# Altium integrated library Mylib Rev 4.IntLib: 207 symbols (part 3 of 3) (continued)
## ST802RT1A (continued)

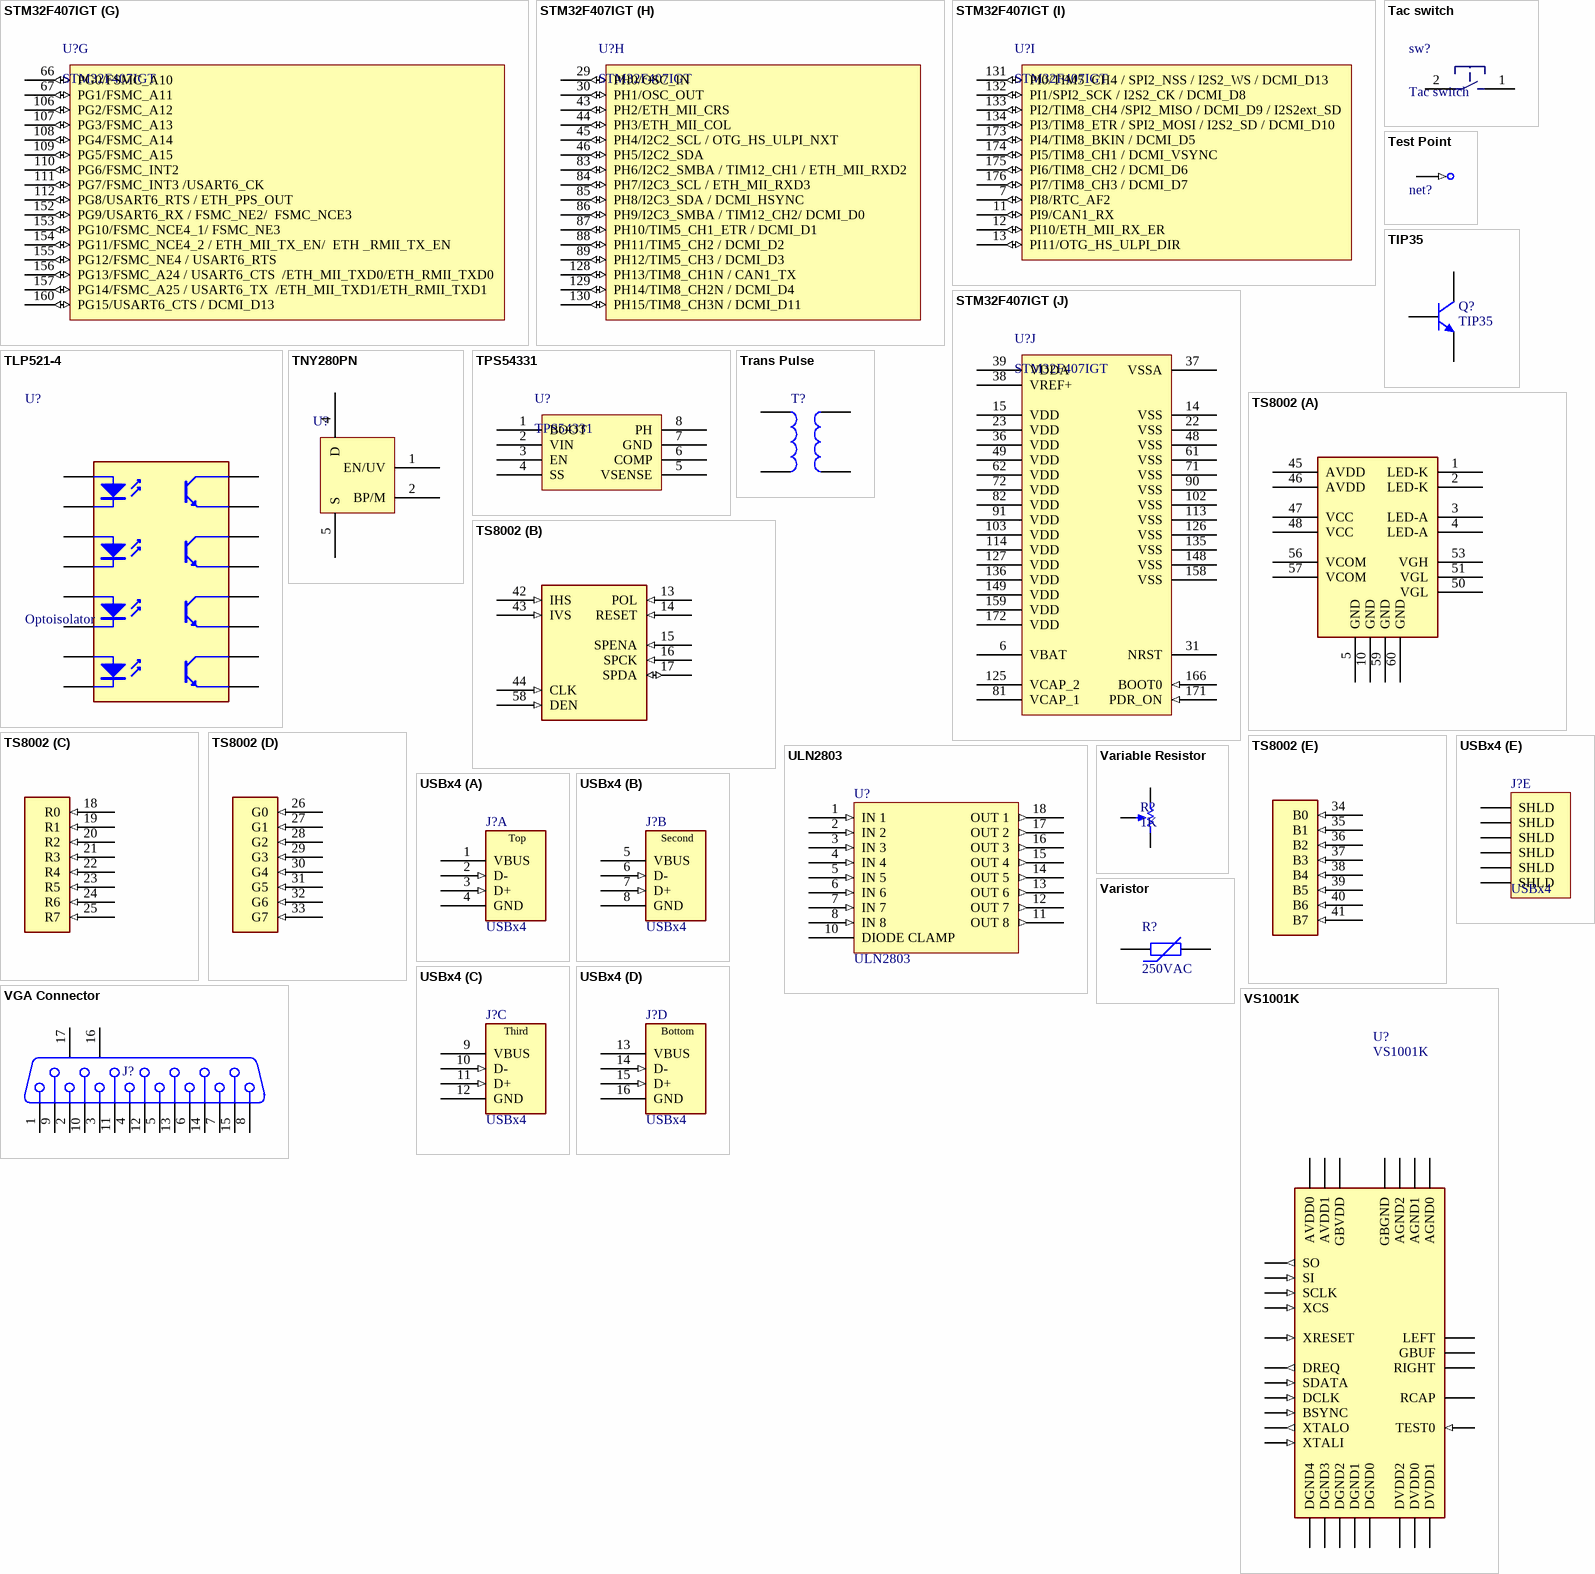
[diagram p16: symbols STM32F407IGT to VS1001K]

## STM32F407IGT
designator U?
ARM Cortex-M4 32b MCU+FPU, 210DMIPS, up to 1MB Flash/192+4KB RAM,  USB OTG HS/FS, Ethernet, 17 TIMs, 3 ADCs, 15 comm. interfaces & camera; ASiD Part Number: STM32F407IGT-AS
footprint MY_TQFP176
part A pins: 40 PA0/USART2_CTS/ USART4_TX/  ETH_MII_CRS / TIM2_CH1_ETR/  TIM5_CH1 / TIM8_ETR/ADC123_IN0/WKUP (io), 41 PA1/USART2_RTS / USART4_RX/  ETH_RMII_REF_CLK / ETH_MII_RX_CLK / TIM5_CH2 /  TIMM2_CH2/ADC123_IN1 (io), 42 PA2/USART2_TX/TIM5_CH3 / TIM9_CH1 / TIM2_CH3 /  ETH_MDIO/ADC123_IN2 (io), 47 PA3/USART2_RX/TIM5_CH4 / TIM9_CH2 / TIM2_CH4 /  OTG_HS_ULPI_D0 / ETH_MII_COL/ADC123_IN3 (io), 50 PA4/SPI1_NSS / SPI3_NSS / USART2_CK / DCMI_HSYNC /  OTG_HS_SOF/ I2S3_WS/ADC12_IN4 /DAC1_OUT (io), 51 PA5/SPI1_SCK/ OTG_HS_ULPI_CK / / TIM2_CH1_ETR/  TIM8_CHIN/ADC12_IN5/DAC2_OUT (io), 52 PA6/SPI1_MISO / TIM8_BKIN/TIM13_CH1 / DCMI_PIXCLK /  TIM3_CH1 / TIM1_BKIN/ADC12_IN6 (io), 53 PA7/SPI1_MOSI/ TIM8_CH1N / TIM14_CH1  TIM3_CH2/ ETH_MII_RX_DV / TIM1_CH1N /  RMII_CRS_DV/ADC12_IN7 (io), 119 PA8/MCO1 / USART1_CK/ TIM1_CH1/ I2C3_SCL/  OTG_FS_SOF (io), 120 PA9/USART1_TX/ TIM1_CH2 / I2C3_SMBA /  DCMI_D0/OTG_FS_VBUS (io), 121 PA10/USART1_RX/ TIM1_CH3/ OTG_FS_ID/DCMI_D1 (io), 122 PA11/USART1_CTS / CAN1_RX / TIM1_CH4 / OTG_FS_DM (io), 123 PA12/USART1_RTS / CAN1_TX/ TIM1_ETR/ OTG_FS_DP (io), 124 JTMS-SWDIO/PA13 (io), 137 JTCK-SWCLK/PA14 (io), 138 JTDI/PA15/SPI3_NSS/ I2S3_WS/TIM2_CH1_ETR / SPI1_NSS (io)
part B pins: 56 PB0/TIM3_CH3 / TIM8_CH2N/ OTG_HS_ULPI_D1/  ETH_MII_RXD2 / TIM1_CH2N/ADC12_IN8 (io), 57 PB1/TIM3_CH4 / TIM8_CH3N/ OTG_HS_ULPI_D2/  ETH_MII_RXD3 / OTG_HS_INTN /  TIM1_CH3N/ADC12_IN9 (io), 58 PB2/BOOT1 (io), 79 PB10/SPI2_SCK / I2S2_CK / I2C2_SCL/ USART3_TX /  OTG_HS_ULPI_D3 / ETH_MII_RX_ER / OTG_HS_SCL /  TIM2_CH3 (io), 80 PB11/I2C2_SDA/USART3_RX/ OTG_HS_ULPI_D4 /  ETH_RMII_TX_EN/ ETH_MII_TX_EN / OTG_HS_SDA /  TIM2_CH4 (io), 92 PB12/SPI2_NSS / I2S2_WS / I2C2_SMBA/  USART3_CK/ TIM1_BKIN / CAN2_RX / OTG_HS_ULPI_D5/  ETH_RMII_TXD0 / ETH_MII_TXD0/ OTG_HS_ID (io), 93 PB13/SPI2_SCK / I2S2_CK / USART3_CTS/  TIM1_CH1N /CAN2_TX / OTG_HS_ULPI_D6 /  ETH_RMII_TXD1 / ETH_MII_TXD1/  OTG_HS_VBUS (io), 94 PB14/SPI2_MISO/ TIM1_CH2N / TIM12_CH1 /  OTG_HS_DMUSART3_RTS / TIM8_CH2N/I2S2ext_SD (io), 95 PB15/SPI2_MOSI / I2S2_SD/ TIM1_CH3N / TIM8_CH3N /  TIM12_CH2 / OTG_HS_DP (io), 161 JTDO/  TRACESWO/PB3/SPI3_SCK / I2S3_CK / TIM2_CH2 /  SPI1_SCK (io), 162 NJTRST/ PB4/SPI3_MISO / TIM3_CH1 / SPI1_MISO /  I2S3ext_SD (io), 163 PB5/I2C1_SMBA/ CAN2_RX / OTG_HS_ULPI_D7 /  ETH_PPS_OUT/TIM3_CH2 / SPI1_MOSI/ SPI3_MOSI /  DCMI_D10 / I2S3_SD (io), 164 PB6/I2C1_SCL/ TIM4_CH1 / CAN2_TX /OTG_FS_INTN /  DCMI_D5/USART1_TX (io), 165 PB7/I2C1_SDA / FSMC_NL / DCMI_VSYNC / USART1_RX/  TIM4_CH2 (io), 167 PB8/TIM4_CH3/SDIO_D4/ TIM10_CH1 / DCMI_D6 /  OTG_FS_SCL/ ETH_MII_TXD3 / I2C1_SCL/ CAN1_RX (io), 168 PB9/SPI2_NSS/ I2S2_WS / TIM4_CH4/ TIM11_CH1/  OTG_FS_SDA/ SDIO_D5 / DCMI_D7 / I2C1_SDA /  CAN1_TX (io)
part C pins: 8 PC13/RTC_AF1 (io), 9 PC14/OSC32_IN (io), 10 PC15/OSC32_OUT (io), 32 PC0/OTG_HS_ULPI_STP/ADC123_IN10 (io), 33 PC1/ETH_MDC/ADC123_IN11 (io), 34 PC2/SPI2_MISO / OTG_HS_ULPI_DIR / TH_MII_TXD2  /I2S2ext_SD/ADC123_IN12 (io), 35 PC3/SPI2_MOSI / I2S2_SD / OTG_HS_ULPI_NXT /  ETH_MII_TX_CLK/ADC123_IN13 (io), 54 PC4/ETH_RMII_RX_D0 / ETH_MII_RX_D0/  ADC12_IN14 (io), 55 PC5/ETH_RMII_RX_D1 / ETH_MII_RX_D1/  ADC12_IN15 (io), 115 PC6/I2S2_MCK / TIM8_CH1/SDIO_D6 / USART6_TX /  DCMI_D0/TIM3_CH1 (io), 116 PC7/I2S3_MCK / TIM8_CH2/SDIO_D7 / USART6_RX /  DCMI_D1/TIM3_CH2 (io), 117 PC8/TIM8_CH3/SDIO_D0 /TIM3_CH3/ USART6_CK / DCMI_D2 (io), 118 PC9/I2S_CKIN/ MCO2 / TIM8_CH4/SDIO_D1 / /I2C3_SDA /  DCMI_D3 / TIM3_CH4 (io), 139 PC10/SPI3_SCK / I2S3_CK/ UART4_TX/SDIO_D2 / DCMI_D8 /  USART3_TX (io), 140 PC11/UART4_RX/ SPI3_MISO / SDIO_D3 /  DCMI_D4/USART3_RX / I2S3ext_SD (io), 141 PC12/UART5_TX/SDIO_CK / DCMI_D9 / SPI3_MOSI /  I2S3_SD / USART3_CK (io)
part D pins: 96 PD8/FSMC_D13 / USART3_TX (io), 97 PD9/FSMC_D14 / USART3_RX (io), 98 PD10/FSMC_D15 / USART3_CK (io), 99 PD11/FSMC_A16/USART3_CTS (io), 100 PD12/FSMC_A17/TIM4_CH1 / USART3_RTS (io), 101 PD13/FSMC_A18/TIM4_CH2 (io), 104 PD14/FSMC_D0/TIM4_CH3 (io), 105 PD15/FSMC_D1/TIM4_CH4 (io), 142 PD0/FSMC_D2/CAN1_RX (io), 143 PD1/FSMC_D3 / CAN1_TX (io), 144 PD2/TIM3_ETR/UART5_RX  SDIO_CMD / DCMI_D11 (io), 145 PD3/FSMC_CLK/USART2_CTS (io), 146 PD4/FSMC_NOE/USART2_RTS (io), 147 PD5/FSMC_NWE/USART2_TX (io), 150 PD6/FSMC_NWAIT/USART2_RX (io), 151 PD7/USART2_CK/FSMC_NE1/FSMC_NCE2 (io)
part E pins: 1 PE2/TRACECLK/ FSMC_A23 / ETH_MII_TXD3 (io), 2 PE3/TRACED0/FSMC_A19 (io), 3 PE4/TRACED1/FSMC_A20 / DCMI_D4 (io), 4 PE5/TRACED2 / FSMC_A21 / TIM9_CH1 / DCMI_D6 (io), 5 PE6/TRACED3 / FSMC_A22 / TIM9_CH2 / DCMI_D7 (io), 68 PE7/FSMC_D4/TIM1_ETR (io), 69 PE8/FSMC_D5/  TIM1_CH1N (io), 70 PE9/FSMC_D6/TIM1_CH1 (io), 73 PE10/FSMC_D7/TIM1_CH2N (io), 74 PE11/FSMC_D8/TIM1_CH2 (io), 75 PE12/FSMC_D9/TIM1_CH3N (io), 76 PE13/FSMC_D10/TIM1_CH3 (io), 77 PE14/FSMC_D11/TIM1_CH4 (io), 78 PE15/FSMC_D12/TIM1_BKIN (io), 169 PE0/TIM4_ETR / FSMC_NBL0 / DCMI_D2 (io), 170 PE1/FSMC_NBL1 / DCMI_D3 (io)
part F pins: 16 PF0/FSMC_A0 / I2C2_SDA (io), 17 PF1/FSMC_A1 / I2C2_SCL (io), 18 PF2/FSMC_A2 / I2C2_SMBA (io), 19 PF3/FSMC_A3/ADC3_IN9 (io), 20 PF4/FSMC_A4/ADC3_IN14 (io), 21 PF5/FSMC_A5/ADC3_IN15 (io), 24 PF6/TIM10_CH1 / FSMC_NIORD/ADC3_IN4 (io), 25 PF7/TIM11_CH1/FSMC_NREG/ADC3_IN5 (io), 26 PF8/TIM13_CH1 / FSMC_NIOWR/ADC3_IN6 (io), 27 PF9/TIM14_CH1 / FSMC_CD/ADC3_IN7 (io), 28 PF10/FSMC_INTR (io), 59 PF11/DCMI_12 (io), 60 PF12/FSMC_A6 (io), 63 PF13/FSMC_A7 (io), 64 PF14/FSMC_A8 (io), 65 PF15/FSMC_A9 (io)
part G pins: 66 PG0/FSMC_A10 (io), 67 PG1/FSMC_A11 (io), 106 PG2/FSMC_A12 (io), 107 PG3/FSMC_A13 (io), 108 PG4/FSMC_A14 (io), 109 PG5/FSMC_A15 (io), 110 PG6/FSMC_INT2 (io), 111 PG7/FSMC_INT3 /USART6_CK (io), 112 PG8/USART6_RTS / ETH_PPS_OUT (io), 152 PG9/USART6_RX / FSMC_NE2/  FSMC_NCE3 (io), 153 PG10/FSMC_NCE4_1/ FSMC_NE3 (io), 154 PG11/FSMC_NCE4_2 / ETH_MII_TX_EN/  ETH _RMII_TX_EN (io), 155 PG12/FSMC_NE4 / USART6_RTS (io), 156 PG13/FSMC_A24 / USART6_CTS  /ETH_MII_TXD0/ETH_RMII_TXD0 (io), 157 PG14/FSMC_A25 / USART6_TX  /ETH_MII_TXD1/ETH_RMII_TXD1 (io), 160 PG15/USART6_CTS / DCMI_D13 (io)
part H pins: 29 PH0/OSC_IN (io), 30 PH1/OSC_OUT (io), 43 PH2/ETH_MII_CRS (io), 44 PH3/ETH_MII_COL (io), 45 PH4/I2C2_SCL / OTG_HS_ULPI_NXT (io), 46 PH5/I2C2_SDA (io), 83 PH6/I2C2_SMBA / TIM12_CH1 / ETH_MII_RXD2 (io), 84 PH7/I2C3_SCL / ETH_MII_RXD3 (io), 85 PH8/I2C3_SDA / DCMI_HSYNC (io), 86 PH9/I2C3_SMBA / TIM12_CH2/ DCMI_D0 (io), 87 PH10/TIM5_CH1_ETR / DCMI_D1 (io), 88 PH11/TIM5_CH2 / DCMI_D2 (io), 89 PH12/TIM5_CH3 / DCMI_D3 (io), 128 PH13/TIM8_CH1N / CAN1_TX (io), 129 PH14/TIM8_CH2N / DCMI_D4 (io), 130 PH15/TIM8_CH3N / DCMI_D11 (io)
part I pins: 7 PI8/RTC_AF2 (io), 11 PI9/CAN1_RX (io), 12 PI10/ETH_MII_RX_ER (io), 13 PI11/OTG_HS_ULPI_DIR (io), 131 PI0/TIM5_CH4 / SPI2_NSS / I2S2_WS / DCMI_D13 (io), 132 PI1/SPI2_SCK / I2S2_CK / DCMI_D8 (io), 133 PI2/TIM8_CH4 /SPI2_MISO / DCMI_D9 / I2S2ext_SD (io), 134 PI3/TIM8_ETR / SPI2_MOSI / I2S2_SD / DCMI_D10 (io), 173 PI4/TIM8_BKIN / DCMI_D5 (io), 174 PI5/TIM8_CH1 / DCMI_VSYNC (io), 175 PI6/TIM8_CH2 / DCMI_D6 (io), 176 PI7/TIM8_CH3 / DCMI_D7 (io)
part J pins: 6 VBAT (power), 14 VSS (power), 15 VDD (power), 22 VSS (power), 23 VDD (power), 31 NRST, 36 VDD (power), 37 VSSA (power), 38 VREF+ (power), 39 VDDA (power), 48 VSS (power), 49 VDD (power), 61 VSS (power), 62 VDD (power), 71 VSS (power), 72 VDD (power), 81 VCAP_1 (power), 82 VDD (power), 90 VSS (power), 91 VDD (power), 102 VSS (power), 103 VDD (power), 113 VSS (power), 114 VDD (power), 125 VCAP_2 (power), 126 VSS (power), 127 VDD (power), 135 VSS (power), 136 VDD (power), 148 VSS (power), 149 VDD (power), 158 VSS (power), 159 VDD (power), 166 BOOT0 (in), 171 PDR_ON (in), 172 VDD (power)

## Tac switch
designator sw?
small tac switch; ASiD Part Number: Tac switch-AS
footprint MY_TACTILE-PTH
footprint MY_TACTILE-PTH_4X
footprint MY_TACTILE-SMD
footprint MY_PB-SMD (Switch; 2 Leads)
pins: 1, 2

## Test Point
designator TP?, comment net?  (no BOM)
Test point; ASiD Part Number: Test Point-AS
footprint MY_TestPin
footprint MY_Testpad1
footprint MY_Testpad2
pins: 1 (in)

## TIP35
designator Q?
Power NPN transistor; ASiD Part Number: TIP35-AS
footprint My_TOP3
pins: B, C, E

## TLP521-4
designator U?, comment Optoisolator
4 Optoisolator's; ASiD Part Number: TLP521-4-AS
footprint My_DIP16
pins: 1 A, 2 K, 3 A, 4 K, 5 A, 6 K, 7 A, 8 K, 9 E, 10 C, 11 E, 12 C, 13 E, 14 C, 15 E, 16 C

## TNY280PN
designator U?, comment TinySwitch-III Family  (value not drawn)
Energy-Effi cient, Off-Line Switcher With  Enhanced Flexibility and Extended Power Range; ASiD Part Number: TNY280PN-AS
footprint MY_DIP8C
pins: 1 EN/UV, 2 BP/M, 4 D, 5 S

## TPS54331
designator U?
3A, 28V INPUT, STEP DOWN SWIFT™ DC/DC CONVERTER WITH ECO-MODE; ASiD Part Number: TPS54331-AS
footprint My_SOIC_P8
footprint My_SOIC_P8_powerPad
pins: 1 BOOT, 2 VIN, 3 EN, 4 SS, 5 VSENSE, 6 COMP, 7 GND (power), 8 PH

## Trans Pulse
designator T?, comment T  (value not drawn)
Pulse Transformer; ASiD Part Number: Trans Pulse-AS
footprint MY_82721K
footprint MY_82722A
footprint MY_DK30
footprint MY_MFE
footprint MY_U15
pins: 1, 2, 3, 4

## TS8002
designator TFT?  (value not drawn)
320x240  24bit parallel TFT LCD; ASiD Part Number: TS8002-AS
footprint MY_FPC60 (TS8002 TFT lcd)
part A pins: 1 LED-K (power), 2 LED-K (power), 3 LED-A (power), 4 LED-A (power), 5 GND (power), 10 GND (power), 45 AVDD, 46 AVDD, 47 VCC, 48 VCC, 50 VGL, 51 VGL, 53 VGH, 56 VCOM, 57 VCOM, 59 GND (power), 60 GND (power)
part B pins: 13 POL (in), 14 RESET (in), 15 SPENA (in), 16 SPCK (in), 17 SPDA (io), 42 IHS (in), 43 IVS (in), 44 CLK (in), 58 DEN (in)
part C pins: 18 R0 (in), 19 R1 (in), 20 R2 (in), 21 R3 (in), 22 R4 (in), 23 R5 (in), 24 R6 (in), 25 R7 (in)
part D pins: 26 G0 (in), 27 G1 (in), 28 G2 (in), 29 G3 (in), 30 G4 (in), 31 G5 (in), 32 G6 (in), 33 G7 (in)
part E pins: 34 B0 (in), 35 B1 (in), 36 B2 (in), 37 B3 (in), 38 B4 (in), 39 B5 (in), 40 B6 (in), 41 B7 (in)

## ULN2803
designator U?
HIGH-VOLTAGE,HIGH-CURRENT DARLINTON ARRAYS; ASiD Part Number: ULN2803-AS
footprint My_DIP18
footprint MY_SOIC18LW
pins: 1 IN 1 (in), 2 IN 2 (in), 3 IN 3 (in), 4 IN 4 (in), 5 IN 5 (in), 6 IN 6 (in), 7 IN 7 (in), 8 IN 8 (in), 9 GND (power) hidden to GND, 10 DIODE CLAMP, 11 OUT 8 (out), 12 OUT 7 (out), 13 OUT 6 (out), 14 OUT 5 (out), 15 OUT 4 (out), 16 OUT 3 (out), 17 OUT 2 (out), 18 OUT 1 (out)

## USBx4
designator J?
USB 1.1, Right Angle, Thru-Hole, A Type, Receptacle, 4x4x4x4 Position, Fourfold Stacked, Black; ASiD Part Number: USBx4-AS
footprint My_USB_4
part A pins: 1 VBUS (power) "Power", 2 D- (in) "-DATA", 3 D+ (in) "+DATA", 4 GND (power) "Ground"
part B pins: 5 VBUS (power) "Power", 6 D- (in) "-DATA", 7 D+ (in) "+DATA", 8 GND (power) "Ground"
part C pins: 9 VBUS (power) "Power", 10 D- (in) "-DATA", 11 D+ (in) "+DATA", 12 GND (power) "Ground"
part D pins: 13 VBUS (power) "Power", 14 D- (in) "-DATA", 15 D+ (in) "+DATA", 16 GND (power) "Ground"
part E pins: 17 SHLD "Shield", 18 SHLD "Shield", 19 SHLD "Shield", 20 SHLD "Shield", 21 SHLD "Shield", 22 SHLD "Shield"
part A text: Top
part B text: Second
part C text: Third
part D text: Bottom

## Variable Resistor
designator R?, comment 1K
Potentiometer; ASiD Part Number: Variable Resistor-AS; Value: 1K
footprint My_Pot
footprint MY_TRIM_POT
footprint My_Pot_trim
footprint MY_TRIM3296P
footprint MY_TRIM3296W
footprint MY_TRIM3296X
footprint MY_TRIM3296Y
pins: 1 TOP, 2 BOT, 3 TAP
1 alternate drawing of the same symbol

## Varistor
designator R?, comment 250VAC
Varistor (Voltage-Sensitive Resistor); ASiD Part Number: Varist-AS; Value: 250VAC
footprint MY_S07K275
footprint MY_S10K250
footprint MY_S14K275
footprint MY_S20K275
footprint MY_S05K40
pins: 1, 2

## VGA Connector
designator J?  (value not drawn)
Standard Right angle VGA Connector; ASiD Part Number: VGA Connector-AS
footprint MY_VGA
pins: 1, 2, 3, 4, 5, 6, 7, 8, 9, 10, 11, 12, 13, 14, 15, 16 MH1, 17 MH2

## VS1001K
designator U?
Mp3 decoder; ASiD Part Number: VS1001K-AS
footprint MY_LQFP48 (TSQFP, 48-Leads, Body 9.0x9.0mm (max), Pitch 0.50mm, IPC Medium Density)
pins: 3 XRESET (in), 4 DGND0 (power), 6 DVDD0 (power), 8 DREQ (out), 9 DCLK (in), 10 SDATA (in), 13 BSYNC (in), 14 DVDD1 (power), 16 DGND1 (power), 17 XTALO (out), 18 XTALI (in), 19 DVDD2 (power), 20 DGND2 (power), 21 DGND3 (power), 22 DGND4 (power), 23 XCS (in), 28 SCLK (in), 29 SI (in), 30 SO (out), 32 TEST0 (in), 37 AGND0 (power), 38 AVDD0 (power), 39 RIGHT, 40 AGND1 (power), 41 GBGND (power), 42 GBUF, 43 GBVDD (power), 44 RCAP, 45 AVDD1 (power), 46 LEFT, 47 AGND2 (power)

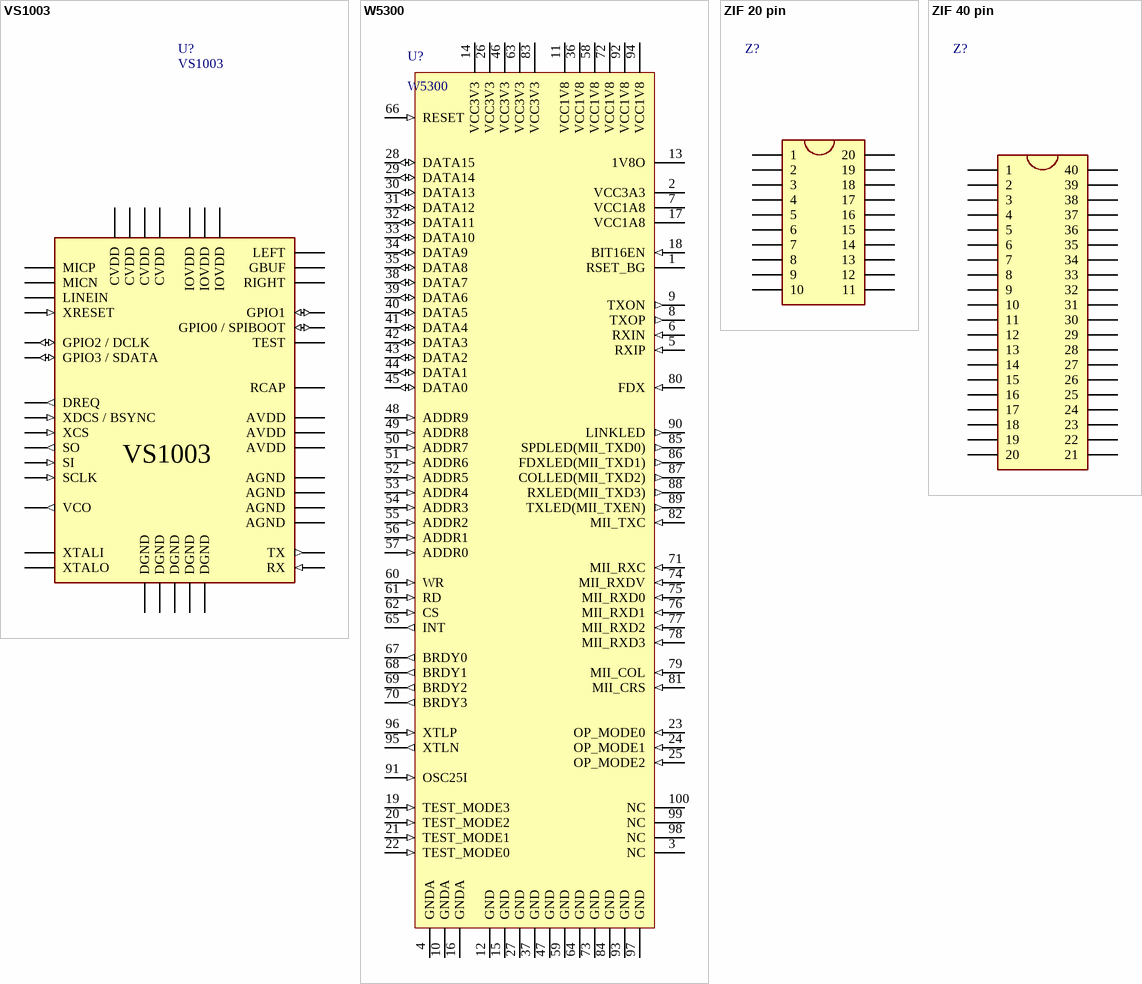
[diagram p17: symbols VS1003 to ZIF 40 pin]

## VS1003
designator U?
MP3 Decoder; ASiD Part Number: VS1003-AS
footprint MY_LQFP48 (TSQFP, 48-Leads, Body 9.0x9.0mm (max), Pitch 0.50mm, IPC Medium Density)
pins: 1 MICP, 2 MICN, 3 XRESET (in), 4 DGND (power), 5 CVDD (power), 6 IOVDD (power), 7 CVDD (power), 8 DREQ (out), 9 GPIO2 / DCLK (io), 10 GPIO3 / SDATA (io), 13 XDCS / BSYNC (in), 14 IOVDD (power), 15 VCO (out), 16 DGND (power), 17 XTALO, 18 XTALI, 19 IOVDD (power), 20 DGND (power), 21 DGND (power), 22 DGND (power), 23 XCS (in), 24 CVDD (power), 26 RX (in), 27 TX (out), 28 SCLK (in), 29 SI (in), 30 SO (out), 31 CVDD (power), 32 TEST, 33 GPIO0 / SPIBOOT (io), 34 GPIO1 (io), 37 AGND (power), 38 AVDD (power), 39 RIGHT, 40 AGND (power), 41 AGND (power), 42 GBUF, 43 AVDD (power), 44 RCAP, 45 AVDD (power), 46 LEFT, 47 AGND (power), 48 LINEIN

## W5300
designator U?
High-Performance Internet Connectivity Solution; ASiD Part Number: W5300-AS
footprint MY_TQFP100
pins: 1 RSET_BG, 2 VCC3A3 (power), 3 NC, 4 GNDA (power), 5 RXIP (in), 6 RXIN (in), 7 VCC1A8 (power), 8 TXOP (out), 9 TXON (out), 10 GNDA (power), 11 VCC1V8 (power), 12 GND (power), 13 1V8O, 14 VCC3V3 (power), 15 GND (power), 16 GNDA (power), 17 VCC1A8 (power), 18 BIT16EN (in), 19 TEST_MODE3 (in), 20 TEST_MODE2 (in), 21 TEST_MODE1 (in), 22 TEST_MODE0 (in), 23 OP_MODE0 (in), 24 OP_MODE1 (in), 25 OP_MODE2 (in), 26 VCC3V3 (power), 27 GND (power), 28 DATA15 (io), 29 DATA14 (io), 30 DATA13 (io), 31 DATA12 (io), 32 DATA11 (io), 33 DATA10 (io), 34 DATA9 (io), 35 DATA8 (io), 36 VCC1V8 (power), 37 GND (power), 38 DATA7 (io), 39 DATA6 (io), 40 DATA5 (io), 41 DATA4 (io), 42 DATA3 (io), 43 DATA2 (io), 44 DATA1 (io), 45 DATA0 (io), 46 VCC3V3 (power), 47 GND (power), 48 ADDR9 (in), 49 ADDR8 (in), 50 ADDR7 (in), 51 ADDR6 (in), 52 ADDR5 (in), 53 ADDR4 (in), 54 ADDR3 (in), 55 ADDR2 (in), 56 ADDR1 (in), 57 ADDR0 (in), 58 VCC1V8 (power), 59 GND (power), 60 WR (in), 61 RD (in), 62 CS (in), 63 VCC3V3 (power), 64 GND (power), 65 INT (out), 66 RESET (in), 67 BRDY0 (out), 68 BRDY1 (out), 69 BRDY2 (out), 70 BRDY3 (out), 71 MII_RXC (in), 72 VCC1V8 (power), 73 GND (power), 74 MII_RXDV (in), 75 MII_RXD0 (in), 76 MII_RXD1 (in), 77 MII_RXD2 (in), 78 MII_RXD3 (in), 79 MII_COL (in), 80 FDX (in), 81 MII_CRS (in), 82 MII_TXC (in), 83 VCC3V3 (power), 84 GND (power), 85 SPDLED(MII_TXD0) (out), 86 FDXLED(MII_TXD1) (out), 87 COLLED(MII_TXD2) (out), 88 RXLED(MII_TXD3) (out), 89 TXLED(MII_TXEN) (out), 90 LINKLED (out), 91 OSC25I (in), 92 VCC1V8 (power), 93 GND (power), 94 VCC1V8 (power), 95 XTLN (out), 96 XTLP (in), 97 GND (power), 98 NC, 99 NC, 100 NC

## ZIF 20 pin
designator Z?, comment ZIF Socket  (value not drawn)
ASiD Part Number: ZIF 20 pin-AS
footprint MY_ZIF20
pins: 1, 2, 3, 4, 5, 6, 7, 8, 9, 10, 11, 12, 13, 14, 15, 16, 17, 18, 19, 20

## ZIF 40 pin
designator Z?, comment ZIF Socket  (value not drawn)
ASiD Part Number: ZIF 40 pin-AS
footprint MY_ZIF40
pins: 1, 2, 3, 4, 5, 6, 7, 8, 9, 10, 11, 12, 13, 14, 15, 16, 17, 18, 19, 20, 21, 22, 23, 24, 25, 26, 27, 28, 29, 30, 31, 32, 33, 34, 35, 36, 37, 38, 39, 40